# Altium footprint library General.PcbLib: 246 footprints (part 15 of 16)
Each footprint in its own frame and in the unit in brackets; x right, y up, seen from the top. Pads: shape width x height; smd on the part's side, far side on the other; paste and mask are expansions set on the pad; w line width, h text height; cw(c..) or ccw(c..) is an arc to the next point about the centre after c.
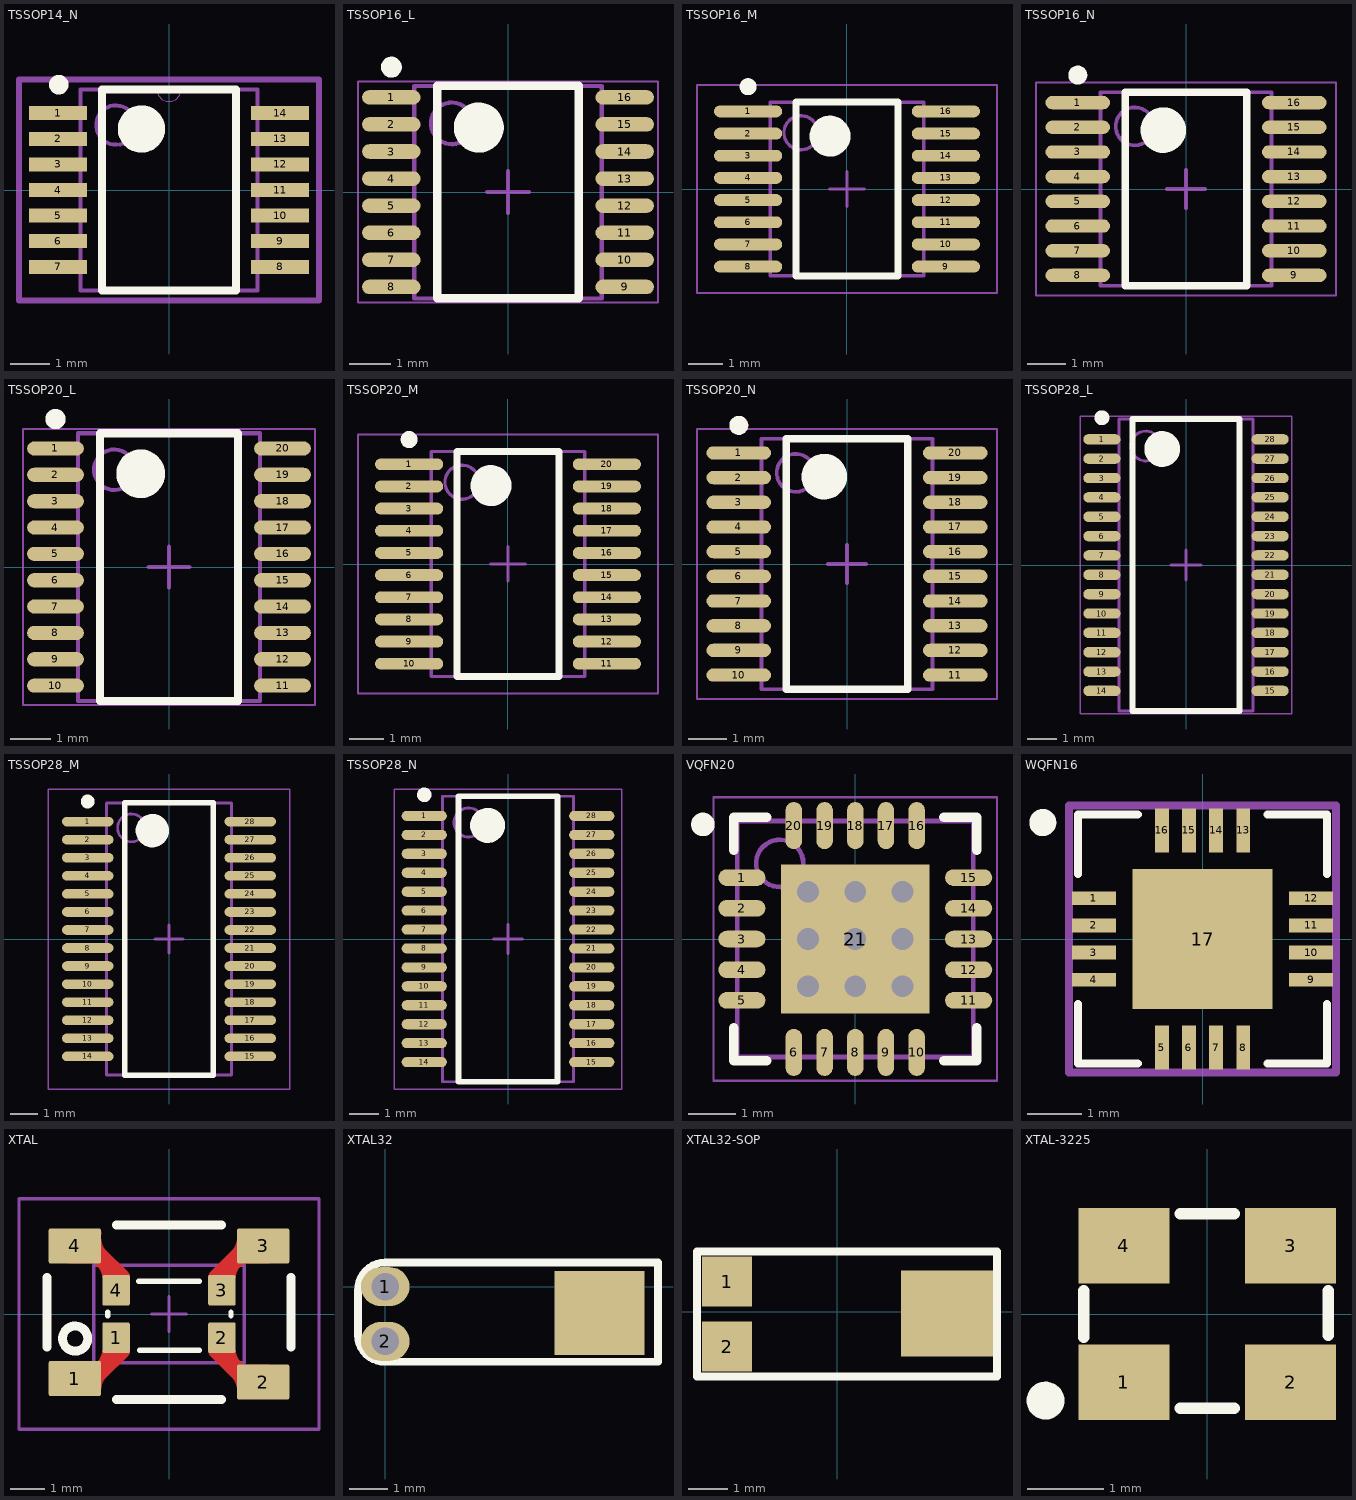
[diagram p14: the footprints below, top view; thin cyan lines are the x and y axes]

## TSSOP14_N [mil]
pads (14):
  rect 58x14 smd mask+4: 1(-111,76.77) 2(-111,51.18) 3(-111,25.59) 4(-111,0) 5(-111,-25.59) 6(-111,-51.18) 7(-111,-76.77) 8(111,-76.77) 9(111,-51.18) 10(111,-25.59) 11(111,0) 12(111,25.59) 13(111,51.18) 14(111,76.77)
Top Overlay:
  circle w23.62: c-27.56,61.02 r11.81
  circle w9.84: c-110.24,105.31 r4.92
  lines w7.87: -66.93,-100.39 66.93,-100.39 66.93,100.39 -66.93,100.39 -66.93,-100.39
Mechanical 13:
  circle w3.94: c-53.15,64.96 r19.68
  lines w0: -12,100.5 ccw(c0,100.5) 12,100.5
  lines w3.94: -88.58,-100.39 -88.58,100.39 88.58,100.39 88.58,-100.39 -88.58,-100.39
Mechanical 15:
  lines w6: -150,-110.5 -150,110.5 150,110.5 150,-110.5 -150,-110.5
3D body "RU_14.stp": height 47.1, standoff 0, extent -126,-100.5 126,100.5

## TSSOP16_L [mm] "TSSOP, 16-Leads, Body 5x4.4mm, Pitch 0.65mm, IPC High Density"
height 1.2
pads (16):
  oval 1.4x0.35 smd: 1(-2.8,2.275) 2(-2.8,1.625) 3(-2.8,0.975) 4(-2.8,0.325) 5(-2.8,-0.325) 6(-2.8,-0.975) 7(-2.8,-1.625) 8(-2.8,-2.275) 9(2.8,-2.275) 10(2.8,-1.625) 11(2.8,-0.975) 12(2.8,-0.325) 13(2.8,0.325) 14(2.8,0.975) 15(2.8,1.625) 16(2.8,2.275)
Top Overlay:
  circle w0.6: c-0.7,1.55 r0.3
  circle w0.25: c-2.8,3 r0.125
  lines w0.2: -1.7,-2.55 1.7,-2.55 1.7,2.55 -1.7,2.55 -1.7,-2.55
Mechanical 13:
  circle w0.1: c-1.35,1.65 r0.5
  lines w0.1: -2.25,-2.55 2.25,-2.55 2.25,2.55 -2.25,2.55 -2.25,-2.55
Mechanical 15:
  lines w0.05: -3.6,-2.65 3.6,-2.65 3.6,2.65 -3.6,2.65 -3.6,-2.65
  lines w0.1: -0.5,0 0.5,0 ; 0,-0.5 0,0.5
3D body "PW0016A.stp": height 1.13, standoff 0, extent -3.174,-2.5 3.226,2.5

## TSSOP16_M [mm] "TSOP, 16-Leads, Body 5x4.4mm, Pitch 0.65mm, IPC Low Density"
height 1.2
pads (16):
  oval 2x0.35 smd: 1(-2.9,2.275) 2(-2.9,1.625) 3(-2.9,0.975) 4(-2.9,0.325) 5(-2.9,-0.325) 6(-2.9,-0.975) 7(-2.9,-1.625) 8(-2.9,-2.275) 9(2.9,-2.275) 10(2.9,-1.625) 11(2.9,-0.975) 12(2.9,-0.325) 13(2.9,0.325) 14(2.9,0.975) 15(2.9,1.625) 16(2.9,2.275)
Top Overlay:
  circle w0.25: c-2.9,3 r0.125
  circle w0.6: c-0.5,1.55 r0.3
  lines w0.2: -1.5,-2.55 -1.5,2.55 1.5,2.55 1.5,-2.55 -1.5,-2.55
Mechanical 13:
  circle w0.1: c-1.35,1.65 r0.5
  lines w0.1: -2.25,-2.55 -2.25,2.55 2.25,2.55 2.25,-2.55 -2.25,-2.55
Mechanical 15:
  lines w0.05: -4.4,-3.05 -4.4,3.05 4.4,3.05 4.4,-3.05 -4.4,-3.05
  lines w0.1: -0.5,0 0.5,0 ; 0,-0.5 0,0.5
3D body "PW0016A.stp": height 1.13, standoff 0, extent -3.2,-2.5 3.2,2.5

## TSSOP16_N [mm] "TSOP, 16-Leads, Body 5x4.4mm, Pitch 0.65mm, IPC Medium Density"
height 1.2
pads (16):
  oval 1.7x0.35 smd: 1(-2.85,2.275) 2(-2.85,1.625) 3(-2.85,0.975) 4(-2.85,0.325) 5(-2.85,-0.325) 6(-2.85,-0.975) 7(-2.85,-1.625) 8(-2.85,-2.275) 9(2.85,-2.275) 10(2.85,-1.625) 11(2.85,-0.975) 12(2.85,-0.325) 13(2.85,0.325) 14(2.85,0.975) 15(2.85,1.625) 16(2.85,2.275)
Top Overlay:
  circle w0.25: c-2.85,3 r0.125
  circle w0.6: c-0.6,1.55 r0.3
  lines w0.2: -1.6,-2.55 -1.6,2.55 1.6,2.55 1.6,-2.55 -1.6,-2.55
Mechanical 13:
  circle w0.1: c-1.35,1.65 r0.5
  lines w0.1: -2.25,-2.55 -2.25,2.55 2.25,2.55 2.25,-2.55 -2.25,-2.55
Mechanical 15:
  lines w0.05: -3.95,-2.8 -3.95,2.8 3.95,2.8 3.95,-2.8 -3.95,-2.8
  lines w0.1: -0.5,0 0.5,0 ; 0,-0.5 0,0.5
3D body "PW0016A.stp": height 1.13, standoff 0, extent -3.2,-2.5 3.2,2.5

## TSSOP20_L [mm] "TSSOP, 20-Leads, Body 6.5x4.4mm, Pitch 0.65mm, IPC High Density"
height 1.2
pads (20):
  oval 1.4x0.35 smd: 1(-2.8,2.925) 2(-2.8,2.275) 3(-2.8,1.625) 4(-2.8,0.975) 5(-2.8,0.325) 6(-2.8,-0.325) 7(-2.8,-0.975) 8(-2.8,-1.625) 9(-2.8,-2.275) 10(-2.8,-2.925) 11(2.8,-2.925) 12(2.8,-2.275) 13(2.8,-1.625) 14(2.8,-0.975) 15(2.8,-0.325) 16(2.8,0.325) 17(2.8,0.975) 18(2.8,1.625) 19(2.8,2.275) 20(2.8,2.925)
Top Overlay:
  circle w0.25: c-2.8,3.65 r0.125
  circle w0.6: c-0.7,2.3 r0.3
  lines w0.2: -1.7,-3.3 -1.7,3.3 1.7,3.3 1.7,-3.3 -1.7,-3.3
Mechanical 13:
  circle w0.1: c-1.35,2.4 r0.5
  lines w0.1: -2.25,-3.3 -2.25,3.3 2.25,3.3 2.25,-3.3 -2.25,-3.3
Mechanical 15:
  lines w0.05: -3.6,-3.4 -3.6,3.4 3.6,3.4 3.6,-3.4 -3.6,-3.4
  lines w0.1: -0.5,0 0.5,0 ; 0,-0.5 0,0.5
3D body "SW3dPS-TSSOP-20.STEP": height 1.2, standoff 0, extent -3.275,-3.3 3.275,3.3

## TSSOP20_M [mm] "TSSOP, 20-Leads, Body 6.5x4.4mm, Pitch 0.65mm, IPC Low Density"
height 1.2
pads (20):
  oval 2x0.35 smd: 1(-2.9,2.925) 2(-2.9,2.275) 3(-2.9,1.625) 4(-2.9,0.975) 5(-2.9,0.325) 6(-2.9,-0.325) 7(-2.9,-0.975) 8(-2.9,-1.625) 9(-2.9,-2.275) 10(-2.9,-2.925) 11(2.9,-2.925) 12(2.9,-2.275) 13(2.9,-1.625) 14(2.9,-0.975) 15(2.9,-0.325) 16(2.9,0.325) 17(2.9,0.975) 18(2.9,1.625) 19(2.9,2.275) 20(2.9,2.925)
Top Overlay:
  circle w0.25: c-2.9,3.65 r0.125
  circle w0.6: c-0.5,2.3 r0.3
  lines w0.2: -1.5,-3.3 -1.5,3.3 1.5,3.3 1.5,-3.3 -1.5,-3.3
Mechanical 13:
  circle w0.1: c-1.35,2.4 r0.5
  lines w0.1: -2.25,-3.3 -2.25,3.3 2.25,3.3 2.25,-3.3 -2.25,-3.3
Mechanical 15:
  lines w0.05: -4.4,-3.8 -4.4,3.8 4.4,3.8 4.4,-3.8 -4.4,-3.8
  lines w0.1: -0.5,0 0.5,0 ; 0,-0.5 0,0.5
3D body "SW3dPS-TSSOP-20.STEP": height 1.2, standoff 0, extent -3.275,-3.3 3.275,3.3

## TSSOP20_N [mm] "TSSOP, 20-Leads, Body 6.5x4.4mm, Pitch 0.65mm, IPC Medium Density"
height 1.2
pads (20):
  oval 1.7x0.35 smd: 1(-2.85,2.925) 2(-2.85,2.275) 3(-2.85,1.625) 4(-2.85,0.975) 5(-2.85,0.325) 6(-2.85,-0.325) 7(-2.85,-0.975) 8(-2.85,-1.625) 9(-2.85,-2.275) 10(-2.85,-2.925) 11(2.85,-2.925) 12(2.85,-2.275) 13(2.85,-1.625) 14(2.85,-0.975) 15(2.85,-0.325) 16(2.85,0.325) 17(2.85,0.975) 18(2.85,1.625) 19(2.85,2.275) 20(2.85,2.925)
Top Overlay:
  circle w0.25: c-2.85,3.65 r0.125
  circle w0.6: c-0.6,2.3 r0.3
  lines w0.2: -1.6,-3.3 -1.6,3.3 1.6,3.3 1.6,-3.3 -1.6,-3.3
Mechanical 13:
  circle w0.1: c-1.35,2.4 r0.5
  lines w0.1: -2.25,-3.3 -2.25,3.3 2.25,3.3 2.25,-3.3 -2.25,-3.3
Mechanical 15:
  lines w0.05: -3.95,-3.55 -3.95,3.55 3.95,3.55 3.95,-3.55 -3.95,-3.55
  lines w0.1: -0.5,0 0.5,0 ; 0,-0.5 0,0.5
3D body "SW3dPS-TSSOP-20.STEP": height 1.2, standoff 0, extent -3.275,-3.3 3.275,3.3

## TSSOP28_L [mm] "TSSOP, 28-Leads, Body 9.7x4.4mm, Pitch 0.65mm, IPC High Density"
height 1.2
pads (28):
  oval 1.25x0.35 smd: 1(-2.825,4.225) 2(-2.825,3.575) 3(-2.825,2.925) 4(-2.825,2.275) 5(-2.825,1.625) 6(-2.825,0.975) 7(-2.825,0.325) 8(-2.825,-0.325) 9(-2.825,-0.975) 10(-2.825,-1.625) 11(-2.825,-2.275) 12(-2.825,-2.925) 13(-2.825,-3.575) 14(-2.825,-4.225) 15(2.825,-4.225) 16(2.825,-3.575) 17(2.825,-2.925) 18(2.825,-2.275) 19(2.825,-1.625) 20(2.825,-0.975) 21(2.825,-0.325) 22(2.825,0.325) 23(2.825,0.975) 24(2.825,1.625) 25(2.825,2.275) 26(2.825,2.925) 27(2.825,3.575) 28(2.825,4.225)
Top Overlay:
  circle w0.6: c-0.8,3.9 r0.3
  circle w0.25: c-2.825,4.95 r0.125
  lines w0.2: -1.8,-4.9 1.8,-4.9 1.8,4.9 -1.8,4.9 -1.8,-4.9
Mechanical 13:
  circle w0.1: c-1.35,4 r0.5
  lines w0.1: -2.25,-4.9 2.25,-4.9 2.25,4.9 -2.25,4.9 -2.25,-4.9
Mechanical 15:
  lines w0.05: -3.55,-5 3.55,-5 3.55,5 -3.55,5 -3.55,-5
  lines w0.1: -0.5,0 0.5,0 ; 0,-0.5 0,0.5
3D body "SW3dPS-TSSOP-28_P065.STEP": height 0.97, standoff -0.02, extent -3.2,-4.85 3.2,4.85

## TSSOP28_M [mm] "TSSOP, 28-Leads, Body 9.7x4.4mm, Pitch 0.65mm, IPC Low Density"
height 1.2
pads (28):
  oval 1.85x0.35 smd: 1(-2.925,4.225) 2(-2.925,3.575) 3(-2.925,2.925) 4(-2.925,2.275) 5(-2.925,1.625) 6(-2.925,0.975) 7(-2.925,0.325) 8(-2.925,-0.325) 9(-2.925,-0.975) 10(-2.925,-1.625) 11(-2.925,-2.275) 12(-2.925,-2.925) 13(-2.925,-3.575) 14(-2.925,-4.225) 15(2.925,-4.225) 16(2.925,-3.575) 17(2.925,-2.925) 18(2.925,-2.275) 19(2.925,-1.625) 20(2.925,-0.975) 21(2.925,-0.325) 22(2.925,0.325) 23(2.925,0.975) 24(2.925,1.625) 25(2.925,2.275) 26(2.925,2.925) 27(2.925,3.575) 28(2.925,4.225)
Top Overlay:
  circle w0.6: c-0.6,3.9 r0.3
  circle w0.25: c-2.925,4.95 r0.125
  lines w0.2: -1.6,-4.9 1.6,-4.9 1.6,4.9 -1.6,4.9 -1.6,-4.9
Mechanical 13:
  circle w0.1: c-1.35,4 r0.5
  lines w0.1: -2.25,-4.9 2.25,-4.9 2.25,4.9 -2.25,4.9 -2.25,-4.9
Mechanical 15:
  lines w0.05: -4.35,-5.4 4.35,-5.4 4.35,5.4 -4.35,5.4 -4.35,-5.4
  lines w0.1: -0.5,0 0.5,0 ; 0,-0.5 0,0.5
3D body "SW3dPS-TSSOP-28_P065.STEP": height 0.97, standoff -0.02, extent -3.2,-4.85 3.2,4.85

## TSSOP28_N [mm] "TSSOP, 28-Leads, Body 9.7x4.4mm, Pitch 0.65mm, IPC Medium Density"
height 1.2
pads (28):
  oval 1.55x0.35 smd: 1(-2.875,4.225) 2(-2.875,3.575) 3(-2.875,2.925) 4(-2.875,2.275) 5(-2.875,1.625) 6(-2.875,0.975) 7(-2.875,0.325) 8(-2.875,-0.325) 9(-2.875,-0.975) 10(-2.875,-1.625) 11(-2.875,-2.275) 12(-2.875,-2.925) 13(-2.875,-3.575) 14(-2.875,-4.225) 15(2.875,-4.225) 16(2.875,-3.575) 17(2.875,-2.925) 18(2.875,-2.275) 19(2.875,-1.625) 20(2.875,-0.975) 21(2.875,-0.325) 22(2.875,0.325) 23(2.875,0.975) 24(2.875,1.625) 25(2.875,2.275) 26(2.875,2.925) 27(2.875,3.575) 28(2.875,4.225)
Top Overlay:
  circle w0.25: c-2.875,4.95 r0.125
  circle w0.6: c-0.7,3.9 r0.3
  lines w0.2: -1.7,-4.9 -1.7,4.9 1.7,4.9 1.7,-4.9 -1.7,-4.9
Mechanical 13:
  circle w0.1: c-1.35,4 r0.5
  lines w0.1: -2.25,-4.9 -2.25,4.9 2.25,4.9 2.25,-4.9 -2.25,-4.9
Mechanical 15:
  lines w0.05: -3.9,-5.15 -3.9,5.15 3.9,5.15 3.9,-5.15 -3.9,-5.15
  lines w0.1: -0.5,0 0.5,0 ; 0,-0.5 0,0.5
3D body "SW3dPS-TSSOP-28_P065.STEP": height 0.97, standoff -0.02, extent -3.2,-4.85 3.2,4.85

## VQFN20 [mm] "QFN, 20-Leads, Body 5x5mm, Pitch 0.65mm, Thermal Pad 3.15x3.15mm"
height 1
pads (21):
  oval 1x0.35 smd: 1(-2.4,1.3) 2(-2.4,0.65) 3(-2.4,0) 4(-2.4,-0.65) 5(-2.4,-1.3) 11(2.4,-1.3) 12(2.4,-0.65) 13(2.4,0) 14(2.4,0.65) 15(2.4,1.3)
  oval 0.35x1 smd: 6(-1.3,-2.4) 7(-0.65,-2.4) 8(0,-2.4) 9(0.65,-2.4) 10(1.3,-2.4) 16(1.3,2.4) 17(0.65,2.4) 18(0,2.4) 19(-0.65,2.4) 20(-1.3,2.4)
  rect 3.15x3.15 smd: 21(0,0)
via -1,1 diameter 0.762 hole 0.457
via 0,1 diameter 0.762 hole 0.457
via 1,1 diameter 0.762 hole 0.457
via -1,0 diameter 0.762 hole 0.457
via 0,0 diameter 0.762 hole 0.457
via 1,0 diameter 0.762 hole 0.457
via -1,-1 diameter 0.762 hole 0.457
via 0,-1 diameter 0.762 hole 0.457
via 1,-1 diameter 0.762 hole 0.457
Top Overlay:
  circle w0.25: c-3.225,2.425 r0.125
  lines w0.2: -2.575,-1.875 -2.575,-2.575 -1.875,-2.575 ; -2.575,1.875 -2.575,2.575 -1.875,2.575 ; 1.875,-2.575 2.575,-2.575 2.575,-1.875 ; 1.875,2.575 2.575,2.575 2.575,1.875
Mechanical 13:
  circle w0.1: c-1.6,1.6 r0.5
  lines w0.1: -2.5,-2.5 -2.5,2.5 2.5,2.5 2.5,-2.5 -2.5,-2.5
Mechanical 15:
  lines w0.05: -3,-3 -3,3 3,3 3,-3 -3,-3
  lines w0.1: -0.5,0 0.5,0 ; 0,-0.5 0,0.5
3D body "QFN65P500X500X100_HS-21N.step": height 1, standoff 0, extent -2.655,-2.655 2.655,2.655

## WQFN16 [mil]
pads (17):
  rect 32x10 smd: 1(-79,29.53) 2(-79,9.84) 3(-79,-9.84) 4(-79,-29.53) 9(79,-29.53) 10(79,-9.84) 11(79,9.84) 12(79,29.53)
  rect 10x32 smd: 5(-29.53,-79) 6(-9.84,-79) 7(9.84,-79) 8(29.53,-79) 13(29.53,79) 14(9.84,79) 15(-9.84,79) 16(-29.53,79)
  rect 102x102 smd: 17(0,0)
Top Overlay:
  circle w9.84: c-116.09,84.59 r4.92
  lines w6: -90.5,-47.15 -90.5,-90.5 -47.15,-90.5 ; -90.5,47.15 -90.5,90.5 -47.15,90.5 ; 47.15,-90.5 90.5,-90.5 90.5,-47.15 ; 47.15,90.5 90.5,90.5 90.5,47.15
Mechanical 15:
  lines w6: -97,-97 -97,97 97,97 97,-97 -97,-97
3D body: height 49.61, standoff -49.21, extent 0,0 0,0
3D body "RGH0016A.stp": height 30.51, standoff -0.98, extent -78.73,-78.73 78.75,78.75

## XTAL [mm]
height 0.75
pads (8):
  rrect10% 1.5x1 smd: 1(-2.7,-1.85) 2(2.7,-1.95) 3(2.7,1.95) 4(-2.7,1.95)
  rrect10% 0.78x0.87 smd: 1(-1.515,-0.68) 2(1.515,-0.68) 3(1.515,0.68) 4(-1.515,0.68)
Top Layer:
  region: -2.875,1.45 -2.222,1.45 -2.202,1.449 -2.162,1.441 -2.124,1.425 -2.09,1.403 -2.075,1.389 -2.031,1.345 -2.003,1.314 -1.956,1.244 -1.924,1.166 -1.907,1.083 -1.905,1.041 -1.125,1.041 -1.125,1.077 -1.125,1.093 -1.131,1.125 -1.144,1.155 -1.162,1.182 -1.173,1.193 -1.806,1.826 -1.839,1.862 -1.892,1.942 -1.929,2.031 -1.948,2.125 -1.95,2.173 -1.949,2.363 -1.961,2.352 -1.989,2.333 -2.02,2.32 -2.053,2.314 -2.07,2.313 -2.163,2.313
  region: 2.878,1.449 2.226,1.449 2.205,1.448 2.165,1.44 2.127,1.425 2.094,1.402 2.078,1.388 2.034,1.344 2.006,1.313 1.959,1.243 1.927,1.165 1.91,1.082 1.908,1.04 1.128,1.04 1.128,1.076 1.128,1.093 1.135,1.124 1.147,1.154 1.165,1.181 1.176,1.192 1.81,1.826 1.842,1.861 1.895,1.941 1.932,2.03 1.951,2.124 1.953,2.172 1.952,2.362 1.965,2.351 1.993,2.333 2.024,2.32 2.056,2.313 2.073,2.312 2.166,2.312
  region: 2.878,-1.449 2.226,-1.449 2.205,-1.448 2.165,-1.44 2.127,-1.425 2.094,-1.402 2.078,-1.388 2.034,-1.344 2.006,-1.313 1.959,-1.243 1.927,-1.165 1.91,-1.082 1.908,-1.04 1.128,-1.04 1.128,-1.076 1.128,-1.093 1.135,-1.124 1.147,-1.154 1.165,-1.181 1.176,-1.192 1.81,-1.826 1.842,-1.861 1.895,-1.941 1.932,-2.03 1.951,-2.124 1.953,-2.172 1.961,-2.268 1.952,-2.362 1.965,-2.351 1.993,-2.333 2.024,-2.32 2.056,-2.313 2.073,-2.312 2.166,-2.312
  region: -2.875,-1.45 -2.222,-1.45 -2.202,-1.449 -2.162,-1.441 -2.124,-1.425 -2.09,-1.403 -2.075,-1.389 -2.031,-1.345 -2.003,-1.314 -1.956,-1.244 -1.924,-1.166 -1.907,-1.083 -1.905,-1.041 -1.125,-1.041 -1.125,-1.077 -1.125,-1.093 -1.131,-1.125 -1.144,-1.155 -1.162,-1.182 -1.173,-1.193 -1.806,-1.826 -1.839,-1.862 -1.892,-1.942 -1.929,-2.031 -1.948,-2.125 -1.95,-2.173 -1.95,-2.232 -2.058,-2.213 -2.03,-2.331 -2.042,-2.32 -2.07,-2.301 -2.101,-2.288 -2.134,-2.282 -2.15,-2.281 -2.163,-2.313
Top Overlay:
  circle w0.254: c-2.691,-0.704 r0.361
  lines w0.152: -1.753,-0.051 -1.753,0.051 ; -0.864,0.94 0.864,0.94 ; -0.838,-1.041 0.864,-1.041 ; 1.778,-0.051 1.778,0.051
  lines w0.254: -3.5,-0.95 -3.5,1.05 ; -1.5,-2.45 1.5,-2.45 ; -1.5,2.55 1.5,2.55 ; 3.5,-0.95 3.5,1.05
Mechanical 15:
  lines w0.1: -0.5,0 0.5,0 ; 0,-0.5 0,0.5 ; -4.3,-3.3 4.3,-3.3 4.3,3.3 -4.3,3.3 -4.3,-3.3 ; -2.159,-1.397 -2.159,1.397 2.159,1.397 2.159,-1.397 -2.159,-1.397
3D body "User Library-VX3-Quartz-Oscillator.STEP": height 1.6, standoff 0, extent -3.5,-2.5 3.5,2.5

## XTAL32 [mil]
pads (3):
  oval 50x40 hole 28: 1(0,0) 2(0,-56)
  rect 92.13x86 smd: ""(220,-27)
Top Overlay:
  lines w8: -28,-50 ccw(c-0.5,-49.5) 0,-77 280,-77 280,25 0,25 ccw(c0.5,-3.5) -28,-4 -28,-50
3D body "User Library-KX-26.STEP": height 76.77, standoff -78.74, extent -8.7,-72.27 320.04,18.28

## XTAL32-SOP [mil]
pads (3):
  rect 50x50 smd: 1(-110,30) 2(-110,-35)
  rect 92.13x86 smd: ""(110,-2)
Top Overlay:
  lines w8: -140,-65 160,-65 160,60 -140,60 -140,-65

## XTAL-3225 [mm]
pads (4):
  rect 1.2x1 smd: 1(-1.1,-0.9) 2(1.1,-0.9) 3(1.1,0.9) 4(-1.1,0.9)
Top Overlay:
  circle w0.25: c-2.134,-1.143 r0.125
  lines w0.152: -1.626,-0.305 -1.626,0.305 ; -0.356,-1.245 0.356,-1.245 ; -0.356,1.321 0.356,1.321 ; 1.6,-0.279 1.6,0.305
3D body "User Library-3225-1.step": height 0.61, standoff 0, extent -1.625,-1.245 1.575,1.255